# Altium schematic symbol library Capacitor - Aluminium TH.SchLib: 4591 symbols (part 9 of 27) (continued)
## EEU-TP1E122 (continued)
CAP ALUM 1200UF 20% 25V RADIAL; Part Number: EEU-TP1E122; Manufacturer: Panasonic Electronic Components; TemperatureRange: -40C ~ 135C; Type: Polar; Ripple Current: 1.488A @ 120Hz; Value: 1200uF; PartId: 23522; Supplier 1: Digi-Key; Supplier Part Number 1: P14908-ND; ComponentLink1Description: Datasheet; ComponentLink1URL: http://industrial.panasonic.com/www-cgi/jvcr13pz.cgi?E+PZ+4+ABA0132+EEUTP1E122+8+WW; ComponentLink2Description: Digi-Key Listing; ComponentLink2URL: https://www.digikey.com/product-detail/en/panasonic-electronic-components/EEU-TP1E122/P14908-ND/2757738; Tolerance: 20%; Voltage: 25V; Price: 1.82; Device Package: Radial, Can, 12.5mm
footprint CAP AL TH D12.5 L5 H22
pins: 1, 2

## EEU-TP1E122B
designator C?, comment 1200uF  (value not drawn)
CAP ALUM 1200UF 20% 25V RADIAL; Part Number: EEU-TP1E122B; Manufacturer: Panasonic Electronic Components; TemperatureRange: -40C ~ 135C; Type: Polar; Ripple Current: 1.488A @ 120Hz; Value: 1200uF; PartId: 23313; Supplier 1: Digi-Key; Supplier Part Number 1: P15691TB-ND; ComponentLink1Description: Datasheet; ComponentLink1URL: http://industrial.panasonic.com/www-cgi/jvcr13pz.cgi?E+PZ+4+ABA0132+EEUTP1E122B+8+WW; ComponentLink2Description: Digi-Key Listing; ComponentLink2URL: https://www.digikey.com/product-detail/en/panasonic-electronic-components/EEU-TP1E122B/P15691TB-ND/2756355; Tolerance: 20%; Voltage: 25V; Price: 0.8126; Device Package: Radial, Can, 12.5mm
footprint CAP AL TH D12.5 L5 H22
pins: 1, 2

## EEU-TP1E182
designator C?, comment 1800uF  (value not drawn)
CAP ALUM 1800UF 20% 25V RADIAL; Part Number: EEU-TP1E182; Manufacturer: Panasonic Electronic Components; TemperatureRange: -40C ~ 135C; Type: Polar; Ripple Current: 1.744A @ 120Hz; Value: 1800uF; PartId: 24183; Supplier 1: Digi-Key; Supplier Part Number 1: P14907-ND; ComponentLink1Description: Datasheet; ComponentLink1URL: http://industrial.panasonic.com/www-cgi/jvcr13pz.cgi?E+PZ+4+ABA0132+EEUTP1E182+8+WW; ComponentLink2Description: Digi-Key Listing; ComponentLink2URL: https://www.digikey.com/product-detail/en/panasonic-electronic-components/EEU-TP1E182/P14907-ND/2757740; Tolerance: 20%; Voltage: 25V; Price: 1.95; Device Package: Radial, Can, 12.5mm
footprint CAP AL TH D12.5 L5 H27
pins: 1, 2

## EEU-TP1E182B
designator C?, comment 1800uF  (value not drawn)
CAP ALUM 1800UF 20% 25V RADIAL; Part Number: EEU-TP1E182B; Manufacturer: Panasonic Electronic Components; TemperatureRange: -40C ~ 135C; Type: Polar; Ripple Current: 1.744A @ 120Hz; Value: 1800uF; PartId: 24191; Supplier 1: Digi-Key; Supplier Part Number 1: P15692CT-ND; ComponentLink1Description: Datasheet; ComponentLink2Description: Digi-Key Listing; ComponentLink2URL: https://www.digikey.com/product-detail/en/panasonic-electronic-components/EEU-TP1E182B/P15692CT-ND/3831059; Tolerance: 20%; Voltage: 25V; Price: 2.19; Device Package: Radial, Can, 12.5mm
footprint CAP AL TH D12.5 L5 H27
pins: 1, 2

## EEU-TP1E182S
designator C?, comment 1800uF  (value not drawn)
CAP ALUM 1800UF 20% 25V RADIAL; Part Number: EEU-TP1E182S; Manufacturer: Panasonic Electronic Components; TemperatureRange: -40C ~ 135C; Type: Polar; Ripple Current: 1.904A @ 120Hz; Value: 1800uF; PartId: 26505; Supplier 1: Digi-Key; Supplier Part Number 1: P14923-ND; ComponentLink1Description: Datasheet; ComponentLink1URL: http://industrial.panasonic.com/www-cgi/jvcr13pz.cgi?E+PZ+4+ABA0132+EEUTP1E182S+8+WW; ComponentLink2Description: Digi-Key Listing; ComponentLink2URL: https://www.digikey.com/product-detail/en/panasonic-electronic-components/EEU-TP1E182S/P14923-ND/2757716; Tolerance: 20%; Voltage: 25V; Price: 2.48; Device Package: Radial, Can, 16mm
footprint CAP AL TH D16 L7.5 H22
pins: 1, 2

## EEU-TP1E182SB
designator C?, comment 1800uF  (value not drawn)
CAP ALUM 1800UF 20% 25V RADIAL; Part Number: EEU-TP1E182SB; Manufacturer: Panasonic Electronic Components; TemperatureRange: -40C ~ 135C; Type: Polar; Ripple Current: 1.904A @ 120Hz; Value: 1800uF; PartId: 26431; Supplier 1: Digi-Key; Supplier Part Number 1: P15693TB-ND; ComponentLink1Description: Datasheet; ComponentLink1URL: http://industrial.panasonic.com/www-cgi/jvcr13pz.cgi?E+PZ+4+ABA0132+EEUTP1E182SB+8+WW; ComponentLink2Description: Digi-Key Listing; ComponentLink2URL: https://www.digikey.com/product-detail/en/panasonic-electronic-components/EEU-TP1E182SB/P15693TB-ND/2756351; Tolerance: 20%; Voltage: 25V; Price: 1.3114; Device Package: Radial, Can, 16mm
footprint CAP AL TH D16 L7.5 H22
pins: 1, 2

## EEU-TP1E202S
designator C?, comment 2000uF  (value not drawn)
CAP ALUM 2000UF 20% 25V RADIAL; Part Number: EEU-TP1E202S; Manufacturer: Panasonic Electronic Components; TemperatureRange: -40C ~ 135C; Type: Polar; Ripple Current: 1.904A @ 120Hz; Value: 2000uF; PartId: 26503; Supplier 1: Digi-Key; Supplier Part Number 1: P14922-ND; ComponentLink1Description: Datasheet; ComponentLink1URL: http://industrial.panasonic.com/www-cgi/jvcr13pz.cgi?E+PZ+4+ABA0132+EEUTP1E202S+8+WW; ComponentLink2Description: Digi-Key Listing; ComponentLink2URL: https://www.digikey.com/product-detail/en/panasonic-electronic-components/EEU-TP1E202S/P14922-ND/2757718; Tolerance: 20%; Voltage: 25V; Price: 2.48; Device Package: Radial, Can, 16mm
footprint CAP AL TH D16 L7.5 H22
pins: 1, 2

## EEU-TP1E202SB
designator C?, comment 2000uF  (value not drawn)
CAP ALUM 2000UF 20% 25V RADIAL; Part Number: EEU-TP1E202SB; Manufacturer: Panasonic Electronic Components; TemperatureRange: -40C ~ 135C; Type: Polar; Ripple Current: 1.904A @ 120Hz; Value: 2000uF; PartId: 26430; Supplier 1: Digi-Key; Supplier Part Number 1: P15694TB-ND; ComponentLink1Description: Datasheet; ComponentLink1URL: http://industrial.panasonic.com/www-cgi/jvcr13pz.cgi?E+PZ+4+ABA0132+EEUTP1E202SB+8+WW; ComponentLink2Description: Digi-Key Listing; ComponentLink2URL: https://www.digikey.com/product-detail/en/panasonic-electronic-components/EEU-TP1E202SB/P15694TB-ND/2756357; Tolerance: 20%; Voltage: 25V; Price: 1.3114; Device Package: Radial, Can, 16mm
footprint CAP AL TH D16 L7.5 H22
pins: 1, 2

## EEU-TP1E221B
designator C?, comment 220uF  (value not drawn)
CAP ALUM 220UF 20% 25V RADIAL; Part Number: EEU-TP1E221B; Manufacturer: Panasonic Electronic Components; TemperatureRange: -40C ~ 135C; Type: Polar; Ripple Current: 377mA @ 120Hz; Value: 220uF; PartId: 24818; Supplier 1: Digi-Key; Supplier Part Number 1: P15684TB-ND; ComponentLink1Description: Datasheet; ComponentLink1URL: http://industrial.panasonic.com/www-cgi/jvcr13pz.cgi?E+PZ+4+ABA0132+EEUTP1E221B+8+WW; ComponentLink2Description: Digi-Key Listing; ComponentLink2URL: https://www.digikey.com/product-detail/en/panasonic-electronic-components/EEU-TP1E221B/P15684TB-ND/2756338; Tolerance: 20%; Voltage: 25V; Price: 0.4564; Device Package: Radial, Can, 10mm
footprint CAP AL TH D10 L5 H14.5
pins: 1, 2

## EEU-TP1E222
designator C?, comment 2200uF  (value not drawn)
CAP ALUM 2200UF 20% 25V RADIAL; Part Number: EEU-TP1E222; Manufacturer: Panasonic Electronic Components; TemperatureRange: -40C ~ 135C; Type: Polar; Ripple Current: 2.208A @ 120Hz; Value: 2200uF; PartId: 26974; Supplier 1: Digi-Key; Supplier Part Number 1: P14906-ND; ComponentLink1Description: Datasheet; ComponentLink1URL: http://industrial.panasonic.com/www-cgi/jvcr13pz.cgi?E+PZ+4+ABA0132+EEUTP1E222+8+WW; ComponentLink2Description: Digi-Key Listing; ComponentLink2URL: https://www.digikey.com/product-detail/en/panasonic-electronic-components/EEU-TP1E222/P14906-ND/2757719; Tolerance: 20%; Voltage: 25V; Price: 2.88; Device Package: Radial, Can, 16mm
footprint CAP AL TH D16 L7.5 H27
pins: 1, 2

## EEU-TP1E272
designator C?, comment 2700uF  (value not drawn)
CAP ALUM 2700UF 20% 25V RADIAL; Part Number: EEU-TP1E272; Manufacturer: Panasonic Electronic Components; TemperatureRange: -40C ~ 135C; Type: Polar; Ripple Current: 2.208A @ 120Hz; Value: 2700uF; PartId: 26973; Supplier 1: Digi-Key; Supplier Part Number 1: P14905-ND; ComponentLink1Description: Datasheet; ComponentLink1URL: http://industrial.panasonic.com/www-cgi/jvcr13pz.cgi?E+PZ+4+ABA0132+EEUTP1E272+8+WW; ComponentLink2Description: Digi-Key Listing; ComponentLink2URL: https://www.digikey.com/product-detail/en/panasonic-electronic-components/EEU-TP1E272/P14905-ND/2757742; Tolerance: 20%; Voltage: 25V; Price: 2.88; Device Package: Radial, Can, 16mm
footprint CAP AL TH D16 L7.5 H27
pins: 1, 2

## EEU-TP1E272B
designator C?, comment 2700uF  (value not drawn)
CAP ALUM 2700UF 20% 25V RADIAL; Part Number: EEU-TP1E272B; Manufacturer: Panasonic Electronic Components; TemperatureRange: -40C ~ 135C; Type: Polar; Ripple Current: 2.208A @ 120Hz; Value: 2700uF; PartId: 26897; Supplier 1: Digi-Key; Supplier Part Number 1: P15697TB-ND; ComponentLink1Description: Datasheet; ComponentLink1URL: http://industrial.panasonic.com/www-cgi/jvcr13pz.cgi?E+PZ+4+ABA0132+EEUTP1E272B+8+WW; ComponentLink2Description: Digi-Key Listing; ComponentLink2URL: https://www.digikey.com/product-detail/en/panasonic-electronic-components/EEU-TP1E272B/P15697TB-ND/2756361; Tolerance: 20%; Voltage: 25V; Price: 1.5266; Device Package: Radial, Can, 16mm
footprint CAP AL TH D16 L7.5 H27
pins: 1, 2

## EEU-TP1E331
designator C?, comment 330uF  (value not drawn)
CAP ALUM 330UF 20% 25V RADIAL; Part Number: EEU-TP1E331; Manufacturer: Panasonic Electronic Components; TemperatureRange: -40C ~ 135C; Type: Polar; Ripple Current: 715mA @ 120Hz; Value: 330uF; PartId: 25429; Supplier 1: Digi-Key; Supplier Part Number 1: P14913-ND; ComponentLink1Description: Datasheet; ComponentLink1URL: http://industrial.panasonic.com/www-cgi/jvcr13pz.cgi?E+PZ+4+ABA0132+EEUTP1E331+8+WW; ComponentLink2Description: Digi-Key Listing; ComponentLink2URL: https://www.digikey.com/product-detail/en/panasonic-electronic-components/EEU-TP1E331/P14913-ND/2757703; Tolerance: 20%; Voltage: 25V; Price: 1.23; Device Package: Radial, Can, 10mm
footprint CAP AL TH D10 L5 H17.5
pins: 1, 2

## EEU-TP1E331B
designator C?, comment 330uF  (value not drawn)
CAP ALUM 330UF 20% 25V RADIAL; Part Number: EEU-TP1E331B; Manufacturer: Panasonic Electronic Components; TemperatureRange: -40C ~ 135C; Type: Polar; Ripple Current: 715mA @ 120Hz; Value: 330uF; PartId: 25232; Supplier 1: Digi-Key; Supplier Part Number 1: P15685TB-ND; ComponentLink1Description: Datasheet; ComponentLink1URL: http://industrial.panasonic.com/www-cgi/jvcr13pz.cgi?E+PZ+4+ABA0132+EEUTP1E331B+8+WW; ComponentLink2Description: Digi-Key Listing; ComponentLink2URL: https://www.digikey.com/product-detail/en/panasonic-electronic-components/EEU-TP1E331B/P15685TB-ND/2756339; Tolerance: 20%; Voltage: 25V; Price: 0.5509; Device Package: Radial, Can, 10mm
footprint CAP AL TH D10 L5 H17.5
pins: 1, 2

## EEU-TP1E332
designator C?, comment 3300uF  (value not drawn)
CAP ALUM 3300UF 20% 25V RADIAL; Part Number: EEU-TP1E332; Manufacturer: Panasonic Electronic Components; TemperatureRange: -40C ~ 135C; Type: Polar; Ripple Current: 2.6A @ 120Hz; Value: 3300uF; PartId: 27283; Supplier 1: Digi-Key; Supplier Part Number 1: P14927-ND; ComponentLink1Description: Datasheet; ComponentLink1URL: http://industrial.panasonic.com/www-cgi/jvcr13pz.cgi?E+PZ+4+ABA0132+EEUTP1E332+8+WW; ComponentLink2Description: Digi-Key Listing; ComponentLink2URL: https://www.digikey.com/product-detail/en/panasonic-electronic-components/EEU-TP1E332/P14927-ND/2757721; Tolerance: 20%; Voltage: 25V; Price: 3.21; Device Package: Radial, Can, 16mm
footprint CAP AL TH D16 L7.5 H33.5
pins: 1, 2

## EEU-TP1E392
designator C?, comment 3900uF  (value not drawn)
CAP ALUM 3900UF 20% 25V RADIAL; Part Number: EEU-TP1E392; Manufacturer: Panasonic Electronic Components; TemperatureRange: -40C ~ 135C; Type: Polar; Ripple Current: 2.6A @ 120Hz; Value: 3900uF; PartId: 27284; Supplier 1: Digi-Key; Supplier Part Number 1: P14926-ND; ComponentLink1Description: Datasheet; ComponentLink1URL: http://industrial.panasonic.com/www-cgi/jvcr13pz.cgi?E+PZ+4+ABA0132+EEUTP1E392+8+WW; ComponentLink2Description: Digi-Key Listing; ComponentLink2URL: https://www.digikey.com/product-detail/en/panasonic-electronic-components/EEU-TP1E392/P14926-ND/2757723; Tolerance: 20%; Voltage: 25V; Price: 3.21; Device Package: Radial, Can, 16mm
footprint CAP AL TH D16 L7.5 H33.5
pins: 1, 2

## EEU-TP1E471
designator C?, comment 470uF  (value not drawn)
CAP ALUM 470UF 20% 25V RADIAL; Part Number: EEU-TP1E471; Manufacturer: Panasonic Electronic Components; TemperatureRange: -40C ~ 135C; Type: Polar; Ripple Current: 825mA @ 120Hz; Value: 470uF; PartId: 25433; Supplier 1: Digi-Key; Supplier Part Number 1: P14912-ND; ComponentLink1Description: Datasheet; ComponentLink1URL: http://industrial.panasonic.com/www-cgi/jvcr13pz.cgi?E+PZ+4+ABA0132+EEUTP1E471+8+WW; ComponentLink2Description: Digi-Key Listing; ComponentLink2URL: https://www.digikey.com/product-detail/en/panasonic-electronic-components/EEU-TP1E471/P14912-ND/2757706; Tolerance: 20%; Voltage: 25V; Price: 1.23; Device Package: Radial, Can, 10mm
footprint CAP AL TH D10 L5 H17.5
pins: 1, 2

## EEU-TP1E511
designator C?, comment 510uF  (value not drawn)
CAP ALUM 510UF 20% 25V RADIAL; Part Number: EEU-TP1E511; Manufacturer: Panasonic Electronic Components; TemperatureRange: -40C ~ 135C; Type: Polar; Ripple Current: 825mA @ 120Hz; Value: 510uF; PartId: 25431; Supplier 1: Digi-Key; Supplier Part Number 1: P14911-ND; ComponentLink1Description: Datasheet; ComponentLink1URL: http://industrial.panasonic.com/www-cgi/jvcr13pz.cgi?E+PZ+4+ABA0132+EEUTP1E511+8+WW; ComponentLink2Description: Digi-Key Listing; ComponentLink2URL: https://www.digikey.com/product-detail/en/panasonic-electronic-components/EEU-TP1E511/P14911-ND/2757726; Tolerance: 20%; Voltage: 25V; Price: 1.23; Device Package: Radial, Can, 10mm
footprint CAP AL TH D10 L5 H17.5
pins: 1, 2

## EEU-TP1E511B
designator C?, comment 510uF  (value not drawn)
CAP ALUM 510UF 20% 25V RADIAL; Part Number: EEU-TP1E511B; Manufacturer: Panasonic Electronic Components; TemperatureRange: -40C ~ 135C; Type: Polar; Ripple Current: 825mA @ 120Hz; Value: 510uF; PartId: 25233; Supplier 1: Digi-Key; Supplier Part Number 1: P15688TB-ND; ComponentLink1Description: Datasheet; ComponentLink1URL: http://industrial.panasonic.com/www-cgi/jvcr13pz.cgi?E+PZ+4+ABA0132+EEUTP1E511B+8+WW; ComponentLink2Description: Digi-Key Listing; ComponentLink2URL: https://www.digikey.com/product-detail/en/panasonic-electronic-components/EEU-TP1E511B/P15688TB-ND/2756343; Tolerance: 20%; Voltage: 25V; Price: 0.5509; Device Package: Radial, Can, 10mm
footprint CAP AL TH D10 L5 H17.5
pins: 1, 2

## EEU-TP1E821
designator C?, comment 820uF  (value not drawn)
CAP ALUM 820UF 20% 25V RADIAL; Part Number: EEU-TP1E821; Manufacturer: Panasonic Electronic Components; TemperatureRange: -40C ~ 135C; Type: Polar; Ripple Current: 1.155A @ 120Hz; Value: 820uF; PartId: 25995; Supplier 1: Digi-Key; Supplier Part Number 1: P14910-ND; ComponentLink1Description: Datasheet; ComponentLink1URL: http://industrial.panasonic.com/www-cgi/jvcr13pz.cgi?E+PZ+4+ABA0132+EEUTP1E821+8+WW; ComponentLink2Description: Digi-Key Listing; ComponentLink2URL: https://www.digikey.com/product-detail/en/panasonic-electronic-components/EEU-TP1E821/P14910-ND/2757708; Tolerance: 20%; Voltage: 25V; Price: 1.41; Device Package: Radial, Can, 10mm
footprint CAP AL TH D10 L5 H22
pins: 1, 2

## EEU-TP1V102
designator C?, comment 1000uF  (value not drawn)
CAP ALUM 1000UF 20% 35V RADIAL; Part Number: EEU-TP1V102; Manufacturer: Panasonic Electronic Components; TemperatureRange: -40C ~ 135C; Type: Polar; Ripple Current: 1.785A @ 120Hz; Value: 1000uF; PartId: 26504; Supplier 1: Digi-Key; Supplier Part Number 1: P14938-ND; ComponentLink1Description: Datasheet; ComponentLink1URL: http://industrial.panasonic.com/www-cgi/jvcr13pz.cgi?E+PZ+4+ABA0132+EEUTP1V102+8+WW; ComponentLink2Description: Digi-Key Listing; ComponentLink2URL: https://www.digikey.com/product-detail/en/panasonic-electronic-components/EEU-TP1V102/P14938-ND/2757707; Tolerance: 20%; Voltage: 35V; Price: 2.48; Device Package: Radial, Can, 16mm
footprint CAP AL TH D16 L7.5 H22
pins: 1, 2

## EEU-TP1V121B
designator C?, comment 120uF  (value not drawn)
CAP ALUM 120UF 20% 35V RADIAL; Part Number: EEU-TP1V121B; Manufacturer: Panasonic Electronic Components; TemperatureRange: -40C ~ 135C; Type: Polar; Ripple Current: 377mA @ 120Hz; Value: 120uF; PartId: 24817; Supplier 1: Digi-Key; Supplier Part Number 1: P15702TB-ND; ComponentLink1Description: Datasheet; ComponentLink1URL: http://industrial.panasonic.com/www-cgi/jvcr13pz.cgi?E+PZ+4+ABA0132+EEUTP1V121B+8+WW; ComponentLink2Description: Digi-Key Listing; ComponentLink2URL: https://www.digikey.com/product-detail/en/panasonic-electronic-components/EEU-TP1V121B/P15702TB-ND/2756372; Tolerance: 20%; Voltage: 35V; Price: 0.4564; Device Package: Radial, Can, 10mm
footprint CAP AL TH D10 L5 H14.5
pins: 1, 2

## EEU-TP1V122
designator C?, comment 1200uF  (value not drawn)
CAP ALUM 1200UF 20% 35V RADIAL; Part Number: EEU-TP1V122; Manufacturer: Panasonic Electronic Components; TemperatureRange: -40C ~ 135C; Type: Polar; Ripple Current: 1.904A @ 120Hz; Value: 1200uF; PartId: 26506; Supplier 1: Digi-Key; Supplier Part Number 1: P14937-ND; ComponentLink1Description: Datasheet; ComponentLink1URL: http://industrial.panasonic.com/www-cgi/jvcr13pz.cgi?E+PZ+4+ABA0132+EEUTP1V122+8+WW; ComponentLink2Description: Digi-Key Listing; ComponentLink2URL: https://www.digikey.com/product-detail/en/panasonic-electronic-components/EEU-TP1V122/P14937-ND/2757727; Tolerance: 20%; Voltage: 35V; Price: 2.48; Device Package: Radial, Can, 16mm
footprint CAP AL TH D16 L7.5 H22
pins: 1, 2

## EEU-TP1V152
designator C?, comment 1500uF  (value not drawn)
CAP ALUM 1500UF 20% 35V RADIAL; Part Number: EEU-TP1V152; Manufacturer: Panasonic Electronic Components; TemperatureRange: -40C ~ 135C; Type: Polar; Ripple Current: 2.208A @ 120Hz; Value: 1500uF; PartId: 26975; Supplier 1: Digi-Key; Supplier Part Number 1: P14936-ND; ComponentLink1Description: Datasheet; ComponentLink1URL: http://industrial.panasonic.com/www-cgi/jvcr13pz.cgi?E+PZ+4+ABA0132+EEUTP1V152+8+WW; ComponentLink2Description: Digi-Key Listing; ComponentLink2URL: https://www.digikey.com/product-detail/en/panasonic-electronic-components/EEU-TP1V152/P14936-ND/2757728; Tolerance: 20%; Voltage: 35V; Price: 2.88; Device Package: Radial, Can, 16mm
footprint CAP AL TH D16 L7.5 H27
pins: 1, 2

## EEU-TP1V152B
designator C?, comment 1500uF  (value not drawn)
CAP ALUM 1500UF 20% 35V RADIAL; Part Number: EEU-TP1V152B; Manufacturer: Panasonic Electronic Components; TemperatureRange: -40C ~ 135C; Type: Polar; Ripple Current: 2.208A @ 120Hz; Value: 1500uF; PartId: 26898; Supplier 1: Digi-Key; Supplier Part Number 1: P15715TB-ND; ComponentLink1Description: Datasheet; ComponentLink1URL: http://industrial.panasonic.com/www-cgi/jvcr13pz.cgi?E+PZ+4+ABA0132+EEUTP1V152B+8+WW; ComponentLink2Description: Digi-Key Listing; ComponentLink2URL: https://www.digikey.com/product-detail/en/panasonic-electronic-components/EEU-TP1V152B/P15715TB-ND/2756370; Tolerance: 20%; Voltage: 35V; Price: 1.5266; Device Package: Radial, Can, 16mm
footprint CAP AL TH D16 L7.5 H27
pins: 1, 2

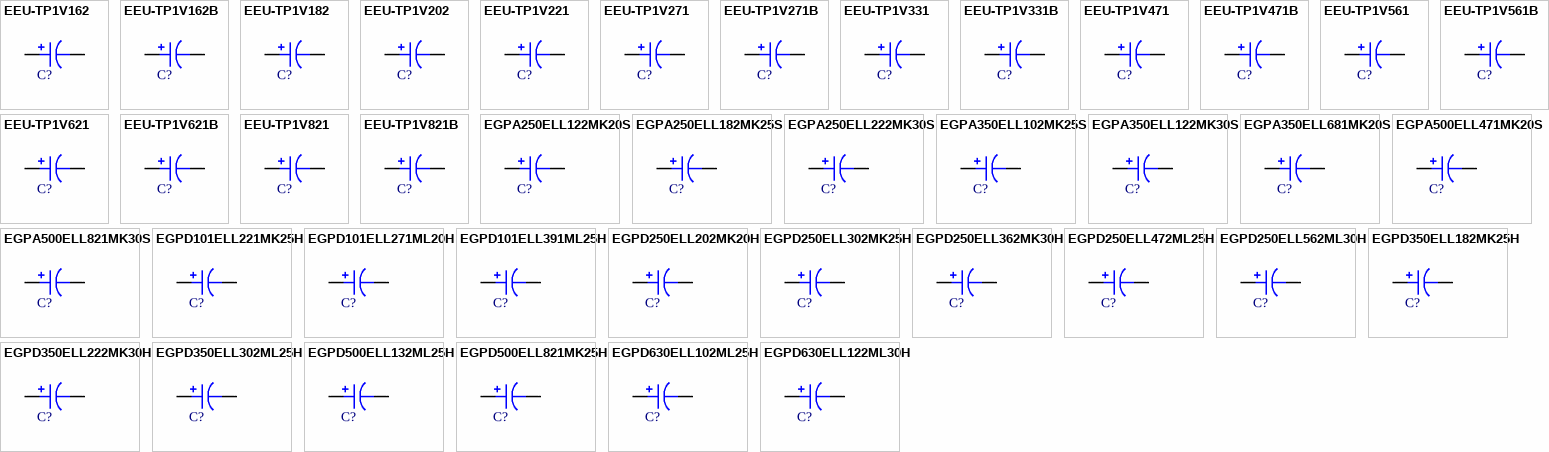
[diagram p38: symbols EEU-TP1V162 to EGPD630ELL122ML30H]

## EEU-TP1V162
designator C?, comment 1600uF  (value not drawn)
CAP ALUM 1600UF 20% 35V RADIAL; Part Number: EEU-TP1V162; Manufacturer: Panasonic Electronic Components; TemperatureRange: -40C ~ 135C; Type: Polar; Ripple Current: 2.208A @ 120Hz; Value: 1600uF; PartId: 26980; Supplier 1: Digi-Key; Supplier Part Number 1: P14935-ND; ComponentLink1Description: Datasheet; ComponentLink1URL: http://industrial.panasonic.com/www-cgi/jvcr13pz.cgi?E+PZ+4+ABA0132+EEUTP1V162+8+WW; ComponentLink2Description: Digi-Key Listing; ComponentLink2URL: https://www.digikey.com/product-detail/en/panasonic-electronic-components/EEU-TP1V162/P14935-ND/2757729; Tolerance: 20%; Voltage: 35V; Price: 3.21; Device Package: Radial, Can, 16mm
footprint CAP AL TH D16 L7.5 H27
pins: 1, 2

## EEU-TP1V162B
designator C?, comment 1600uF  (value not drawn)
CAP ALUM 1600UF 20% 35V RADIAL; Part Number: EEU-TP1V162B; Manufacturer: Panasonic Electronic Components; TemperatureRange: -40C ~ 135C; Type: Polar; Ripple Current: 2.208A @ 120Hz; Value: 1600uF; PartId: 26916; Supplier 1: Digi-Key; Supplier Part Number 1: P15717TB-ND; ComponentLink1Description: Datasheet; ComponentLink1URL: http://industrial.panasonic.com/www-cgi/jvcr13pz.cgi?E+PZ+4+ABA0132+EEUTP1V162B+8+WW; ComponentLink2Description: Digi-Key Listing; ComponentLink2URL: https://www.digikey.com/product-detail/en/panasonic-electronic-components/EEU-TP1V162B/P15717TB-ND/2756362; Tolerance: 20%; Voltage: 35V; Price: 1.6555; Device Package: Radial, Can, 16mm
footprint CAP AL TH D16 L7.5 H27
pins: 1, 2

## EEU-TP1V182
designator C?, comment 1800uF  (value not drawn)
CAP ALUM 1800UF 20% 35V RADIAL; Part Number: EEU-TP1V182; Manufacturer: Panasonic Electronic Components; TemperatureRange: -40C ~ 135C; Type: Polar; Ripple Current: 2.6A @ 120Hz; Value: 1800uF; PartId: 27280; Supplier 1: Digi-Key; Supplier Part Number 1: P14934-ND; ComponentLink1Description: Datasheet; ComponentLink1URL: http://industrial.panasonic.com/www-cgi/jvcr13pz.cgi?E+PZ+4+ABA0132+EEUTP1V182+8+WW; ComponentLink2Description: Digi-Key Listing; ComponentLink2URL: https://www.digikey.com/product-detail/en/panasonic-electronic-components/EEU-TP1V182/P14934-ND/2757730; Tolerance: 20%; Voltage: 35V; Price: 3.17; Device Package: Radial, Can, 16mm
footprint CAP AL TH D16 L7.5 H33.5
pins: 1, 2

## EEU-TP1V202
designator C?, comment 2000uF  (value not drawn)
CAP ALUM 2000UF 20% 35V RADIAL; Part Number: EEU-TP1V202; Manufacturer: Panasonic Electronic Components; TemperatureRange: -40C ~ 135C; Type: Polar; Ripple Current: 2.6A @ 120Hz; Value: 2000uF; PartId: 27279; Supplier 1: Digi-Key; Supplier Part Number 1: P14933-ND; ComponentLink1Description: Datasheet; ComponentLink1URL: http://industrial.panasonic.com/www-cgi/jvcr13pz.cgi?E+PZ+4+ABA0132+EEUTP1V202+8+WW; ComponentLink2Description: Digi-Key Listing; ComponentLink2URL: https://www.digikey.com/product-detail/en/panasonic-electronic-components/EEU-TP1V202/P14933-ND/2757709; Tolerance: 20%; Voltage: 35V; Price: 3.17; Device Package: Radial, Can, 16mm
footprint CAP AL TH D16 L7.5 H33.5
pins: 1, 2

## EEU-TP1V221
designator C?, comment 220uF  (value not drawn)
CAP ALUM 220UF 20% 35V RADIAL; Part Number: EEU-TP1V221; Manufacturer: Panasonic Electronic Components; TemperatureRange: -40C ~ 135C; Type: Polar; Ripple Current: 715mA @ 120Hz; Value: 220uF; PartId: 25432; Supplier 1: Digi-Key; Supplier Part Number 1: P14948-ND; ComponentLink1Description: Datasheet; ComponentLink1URL: http://industrial.panasonic.com/www-cgi/jvcr13pz.cgi?E+PZ+4+ABA0132+EEUTP1V221+8+WW; ComponentLink2Description: Digi-Key Listing; ComponentLink2URL: https://www.digikey.com/product-detail/en/panasonic-electronic-components/EEU-TP1V221/P14948-ND/2757699; Tolerance: 20%; Voltage: 35V; Price: 1.23; Device Package: Radial, Can, 10mm
footprint CAP AL TH D10 L5 H17.5
pins: 1, 2

## EEU-TP1V271
designator C?, comment 270uF  (value not drawn)
CAP ALUM 270UF 20% 35V RADIAL; Part Number: EEU-TP1V271; Manufacturer: Panasonic Electronic Components; TemperatureRange: -40C ~ 135C; Type: Polar; Ripple Current: 715mA @ 120Hz; Value: 270uF; PartId: 25430; Supplier 1: Digi-Key; Supplier Part Number 1: P14947-ND; ComponentLink1Description: Datasheet; ComponentLink1URL: http://industrial.panasonic.com/www-cgi/jvcr13pz.cgi?E+PZ+4+ABA0132+EEUTP1V271+8+WW; ComponentLink2Description: Digi-Key Listing; ComponentLink2URL: https://www.digikey.com/product-detail/en/panasonic-electronic-components/EEU-TP1V271/P14947-ND/2757700; Tolerance: 20%; Voltage: 35V; Price: 1.23; Device Package: Radial, Can, 10mm
footprint CAP AL TH D10 L5 H17.5
pins: 1, 2

## EEU-TP1V271B
designator C?, comment 270uF  (value not drawn)
CAP ALUM 270UF 20% 35V RADIAL; Part Number: EEU-TP1V271B; Manufacturer: Panasonic Electronic Components; TemperatureRange: -40C ~ 135C; Type: Polar; Ripple Current: 715mA @ 120Hz; Value: 270uF; PartId: 25234; Supplier 1: Digi-Key; Supplier Part Number 1: P15705TB-ND; ComponentLink1Description: Datasheet; ComponentLink1URL: http://industrial.panasonic.com/www-cgi/jvcr13pz.cgi?E+PZ+4+ABA0132+EEUTP1V271B+8+WW; ComponentLink2Description: Digi-Key Listing; ComponentLink2URL: https://www.digikey.com/product-detail/en/panasonic-electronic-components/EEU-TP1V271B/P15705TB-ND/2756340; Tolerance: 20%; Voltage: 35V; Price: 0.5509; Device Package: Radial, Can, 10mm
footprint CAP AL TH D10 L5 H17.5
pins: 1, 2

## EEU-TP1V331
designator C?, comment 330uF  (value not drawn)
CAP ALUM 330UF 20% 35V RADIAL; Part Number: EEU-TP1V331; Manufacturer: Panasonic Electronic Components; TemperatureRange: -40C ~ 135C; Type: Polar; Ripple Current: 1.001A @ 120Hz; Value: 330uF; PartId: 25994; Supplier 1: Digi-Key; Supplier Part Number 1: P14944-ND; ComponentLink1Description: Datasheet; ComponentLink1URL: http://industrial.panasonic.com/www-cgi/jvcr13pz.cgi?E+PZ+4+ABA0132+EEUTP1V331+8+WW; ComponentLink2Description: Digi-Key Listing; ComponentLink2URL: https://www.digikey.com/product-detail/en/panasonic-electronic-components/EEU-TP1V331/P14944-ND/2757712; Tolerance: 20%; Voltage: 35V; Price: 1.41; Device Package: Radial, Can, 10mm
footprint CAP AL TH D10 L5 H22
pins: 1, 2

## EEU-TP1V331B
designator C?, comment 330uF  (value not drawn)
CAP ALUM 330UF 20% 35V RADIAL; Part Number: EEU-TP1V331B; Manufacturer: Panasonic Electronic Components; TemperatureRange: -40C ~ 135C; Type: Polar; Ripple Current: 1.001A @ 120Hz; Value: 330uF; PartId: 25866; Supplier 1: Digi-Key; Supplier Part Number 1: P15707TB-ND; ComponentLink1Description: Datasheet; ComponentLink1URL: http://industrial.panasonic.com/www-cgi/jvcr13pz.cgi?E+PZ+4+ABA0132+EEUTP1V331B+8+WW; ComponentLink2Description: Digi-Key Listing; ComponentLink2URL: https://www.digikey.com/product-detail/en/panasonic-electronic-components/EEU-TP1V331B/P15707TB-ND/2756342; Tolerance: 20%; Voltage: 35V; Price: 0.629; Device Package: Radial, Can, 10mm
footprint CAP AL TH D10 L5 H22
pins: 1, 2

## EEU-TP1V471
designator C?, comment 470uF  (value not drawn)
CAP ALUM 470UF 20% 35V RADIAL; Part Number: EEU-TP1V471; Manufacturer: Panasonic Electronic Components; TemperatureRange: -40C ~ 135C; Type: Polar; Ripple Current: 1.395A @ 120Hz; Value: 470uF; PartId: 23517; Supplier 1: Digi-Key; Supplier Part Number 1: P14942-ND; ComponentLink1Description: Datasheet; ComponentLink1URL: http://industrial.panasonic.com/www-cgi/jvcr13pz.cgi?E+PZ+4+ABA0132+EEUTP1V471+8+WW; ComponentLink2Description: Digi-Key Listing; ComponentLink2URL: https://www.digikey.com/product-detail/en/panasonic-electronic-components/EEU-TP1V471/P14942-ND/2757714; Tolerance: 20%; Voltage: 35V; Price: 1.82; Device Package: Radial, Can, 12.5mm
footprint CAP AL TH D12.5 L5 H22
pins: 1, 2

## EEU-TP1V471B
designator C?, comment 470uF  (value not drawn)
CAP ALUM 470UF 20% 35V RADIAL; Part Number: EEU-TP1V471B; Manufacturer: Panasonic Electronic Components; TemperatureRange: -40C ~ 135C; Type: Polar; Ripple Current: 1.395A @ 120Hz; Value: 470uF; PartId: 23525; Supplier 1: Digi-Key; Supplier Part Number 1: P15709CT-ND; ComponentLink1Description: Datasheet; ComponentLink2Description: Digi-Key Listing; ComponentLink2URL: https://www.digikey.com/product-detail/en/panasonic-electronic-components/EEU-TP1V471B/P15709CT-ND/3831076; Tolerance: 20%; Voltage: 35V; Price: 1.82; Device Package: Radial, Can, 12.5mm
footprint CAP AL TH D12.5 L5 H22
pins: 1, 2

## EEU-TP1V561
designator C?, comment 560uF  (value not drawn)
CAP ALUM 560UF 20% 35V RADIAL; Part Number: EEU-TP1V561; Manufacturer: Panasonic Electronic Components; TemperatureRange: -40C ~ 135C; Type: Polar; Ripple Current: 1.395A @ 120Hz; Value: 560uF; PartId: 23521; Supplier 1: Digi-Key; Supplier Part Number 1: P14941-ND; ComponentLink1Description: Datasheet; ComponentLink1URL: http://industrial.panasonic.com/www-cgi/jvcr13pz.cgi?E+PZ+4+ABA0132+EEUTP1V561+8+WW; ComponentLink2Description: Digi-Key Listing; ComponentLink2URL: https://www.digikey.com/product-detail/en/panasonic-electronic-components/EEU-TP1V561/P14941-ND/2757734; Tolerance: 20%; Voltage: 35V; Price: 1.82; Device Package: Radial, Can, 12.5mm
footprint CAP AL TH D12.5 L5 H22
pins: 1, 2

## EEU-TP1V561B
designator C?, comment 560uF  (value not drawn)
CAP ALUM 560UF 20% 35V RADIAL; Part Number: EEU-TP1V561B; Manufacturer: Panasonic Electronic Components; TemperatureRange: -40C ~ 135C; Type: Polar; Ripple Current: 1.395A @ 120Hz; Value: 560uF; PartId: 23314; Supplier 1: Digi-Key; Supplier Part Number 1: P15710TB-ND; ComponentLink1Description: Datasheet; ComponentLink1URL: http://industrial.panasonic.com/www-cgi/jvcr13pz.cgi?E+PZ+4+ABA0132+EEUTP1V561B+8+WW; ComponentLink2Description: Digi-Key Listing; ComponentLink2URL: https://www.digikey.com/product-detail/en/panasonic-electronic-components/EEU-TP1V561B/P15710TB-ND/2756348; Tolerance: 20%; Voltage: 35V; Price: 0.8126; Device Package: Radial, Can, 12.5mm
footprint CAP AL TH D12.5 L5 H22
pins: 1, 2

## EEU-TP1V621
designator C?, comment 620uF  (value not drawn)
CAP ALUM 620UF 20% 35V RADIAL; Part Number: EEU-TP1V621; Manufacturer: Panasonic Electronic Components; TemperatureRange: -40C ~ 135C; Type: Polar; Ripple Current: 1.395A @ 120Hz; Value: 620uF; PartId: 23519; Supplier 1: Digi-Key; Supplier Part Number 1: P14940-ND; ComponentLink1Description: Datasheet; ComponentLink1URL: http://industrial.panasonic.com/www-cgi/jvcr13pz.cgi?E+PZ+4+ABA0132+EEUTP1V621+8+WW; ComponentLink2Description: Digi-Key Listing; ComponentLink2URL: https://www.digikey.com/product-detail/en/panasonic-electronic-components/EEU-TP1V621/P14940-ND/2757736; Tolerance: 20%; Voltage: 35V; Price: 1.82; Device Package: Radial, Can, 12.5mm
footprint CAP AL TH D12.5 L5 H22
pins: 1, 2

## EEU-TP1V621B
designator C?, comment 620uF  (value not drawn)
CAP ALUM 620UF 20% 35V RADIAL; Part Number: EEU-TP1V621B; Manufacturer: Panasonic Electronic Components; TemperatureRange: -40C ~ 135C; Type: Polar; Ripple Current: 1.395A @ 120Hz; Value: 620uF; PartId: 23526; Supplier 1: Digi-Key; Supplier Part Number 1: P15711CT-ND; ComponentLink1Description: Datasheet; ComponentLink2Description: Digi-Key Listing; ComponentLink2URL: https://www.digikey.com/product-detail/en/panasonic-electronic-components/EEU-TP1V621B/P15711CT-ND/3831078; Tolerance: 20%; Voltage: 35V; Price: 1.82; Device Package: Radial, Can, 12.5mm
footprint CAP AL TH D12.5 L5 H22
pins: 1, 2

## EEU-TP1V821
designator C?, comment 820uF  (value not drawn)
CAP ALUM 820UF 20% 35V RADIAL; Part Number: EEU-TP1V821; Manufacturer: Panasonic Electronic Components; TemperatureRange: -40C ~ 135C; Type: Polar; Ripple Current: 1.635A @ 120Hz; Value: 820uF; PartId: 24184; Supplier 1: Digi-Key; Supplier Part Number 1: P14939-ND; ComponentLink1Description: Datasheet; ComponentLink1URL: http://industrial.panasonic.com/www-cgi/jvcr13pz.cgi?E+PZ+4+ABA0132+EEUTP1V821+8+WW; ComponentLink2Description: Digi-Key Listing; ComponentLink2URL: https://www.digikey.com/product-detail/en/panasonic-electronic-components/EEU-TP1V821/P14939-ND/2757715; Tolerance: 20%; Voltage: 35V; Price: 1.95; Device Package: Radial, Can, 12.5mm
footprint CAP AL TH D12.5 L5 H27
pins: 1, 2

## EEU-TP1V821B
designator C?, comment 820uF  (value not drawn)
CAP ALUM 820UF 20% 35V RADIAL; Part Number: EEU-TP1V821B; Manufacturer: Panasonic Electronic Components; TemperatureRange: -40C ~ 135C; Type: Polar; Ripple Current: 1.635A @ 120Hz; Value: 820uF; PartId: 23910; Supplier 1: Digi-Key; Supplier Part Number 1: P15712TB-ND; ComponentLink1Description: Datasheet; ComponentLink1URL: http://industrial.panasonic.com/www-cgi/jvcr13pz.cgi?E+PZ+4+ABA0132+EEUTP1V821B+8+WW; ComponentLink2Description: Digi-Key Listing; ComponentLink2URL: https://www.digikey.com/product-detail/en/panasonic-electronic-components/EEU-TP1V821B/P15712TB-ND/2756350; Tolerance: 20%; Voltage: 35V; Price: 0.9195; Device Package: Radial, Can, 12.5mm
footprint CAP AL TH D12.5 L5 H27
pins: 1, 2

## EGPA250ELL122MK20S
designator C?, comment 1200uF  (value not drawn)
CAP ALUM 1200UF 20% 25V RADIAL; Part Number: EGPA250ELL122MK20S; Manufacturer: United Chemi-Con; TemperatureRange: -40C ~ 125C; Type: Polar; Ripple Current: 1.092A @ 120Hz; Value: 1200uF; PartId: 23015; Supplier 1: Digi-Key; Supplier Part Number 1: 565-3375-ND; ComponentLink1Description: Datasheet; ComponentLink1URL: //media.digikey.com/pdf/Data%20Sheets/United%20Chemi-Con%20PDFs/GPA_Series.PDF; ComponentLink2Description: Digi-Key Listing; ComponentLink2URL: https://www.digikey.com/product-detail/en/united-chemi-con/EGPA250ELL122MK20S/565-3375-ND/3528506; Tolerance: 20%; Voltage: 25V; Price: 0; Device Package: Radial, Can, 12.5mm
footprint CAP AL TH D12.5 L5 H21.5
pins: 1, 2

## EGPA250ELL182MK25S
designator C?, comment 1800uF  (value not drawn)
CAP ALUM 1800UF 20% 25V RADIAL; Part Number: EGPA250ELL182MK25S; Manufacturer: United Chemi-Con; TemperatureRange: -40C ~ 125C; Type: Polar; Ripple Current: 1.368A @ 120Hz; Value: 1800uF; PartId: 23737; Supplier 1: Digi-Key; Supplier Part Number 1: 565-3376-ND; ComponentLink1Description: Datasheet; ComponentLink1URL: //media.digikey.com/pdf/Data%20Sheets/United%20Chemi-Con%20PDFs/GPA_Series.PDF; ComponentLink2Description: Digi-Key Listing; ComponentLink2URL: https://www.digikey.com/product-detail/en/united-chemi-con/EGPA250ELL182MK25S/565-3376-ND/3528508; Tolerance: 20%; Voltage: 25V; Price: 1.54; Device Package: Radial, Can, 12.5mm
footprint CAP AL TH D12.5 L5 H26.5
pins: 1, 2

## EGPA250ELL222MK30S
designator C?, comment 2200uF  (value not drawn)
CAP ALUM 2200UF 20% 25V RADIAL; Part Number: EGPA250ELL222MK30S; Manufacturer: United Chemi-Con; TemperatureRange: -40C ~ 125C; Type: Polar; Ripple Current: 1.92A @ 120Hz; Value: 2200uF; PartId: 24395; Supplier 1: Digi-Key; Supplier Part Number 1: 565-3377-ND; ComponentLink1Description: Datasheet; ComponentLink1URL: //media.digikey.com/pdf/Data%20Sheets/United%20Chemi-Con%20PDFs/GPA_Series.PDF; ComponentLink2Description: Digi-Key Listing; ComponentLink2URL: https://www.digikey.com/product-detail/en/united-chemi-con/EGPA250ELL222MK30S/565-3377-ND/3528510; Tolerance: 20%; Voltage: 25V; Price: 1.82; Device Package: Radial, Can, 12.5mm
footprint CAP AL TH D12.5 L5 H35.5
pins: 1, 2

## EGPA350ELL102MK25S
designator C?, comment 1000uF  (value not drawn)
CAP ALUM 1000UF 20% 35V RADIAL; Part Number: EGPA350ELL102MK25S; Manufacturer: United Chemi-Con; TemperatureRange: -40C ~ 125C; Type: Polar; Ripple Current: 1.368A @ 120Hz; Value: 1000uF; PartId: 23733; Supplier 1: Digi-Key; Supplier Part Number 1: 565-3386-ND; ComponentLink1Description: Datasheet; ComponentLink1URL: //media.digikey.com/pdf/Data%20Sheets/United%20Chemi-Con%20PDFs/GPA_Series.PDF; ComponentLink2Description: Digi-Key Listing; ComponentLink2URL: https://www.digikey.com/product-detail/en/united-chemi-con/EGPA350ELL102MK25S/565-3386-ND/3528524; Tolerance: 20%; Voltage: 35V; Price: 1.46; Device Package: Radial, Can, 12.5mm
footprint CAP AL TH D12.5 L5 H26.5
pins: 1, 2